# Altium footprint library master.PcbLib: 98 footprints (part 2 of 7)
Each footprint in its own frame and in the unit in brackets; x right, y up, seen from the top. Pads: shape width x height; smd on the part's side, far side on the other; paste and mask are expansions set on the pad; w line width, h text height; cw(c..) or ccw(c..) is an arc to the next point about the centre after c.
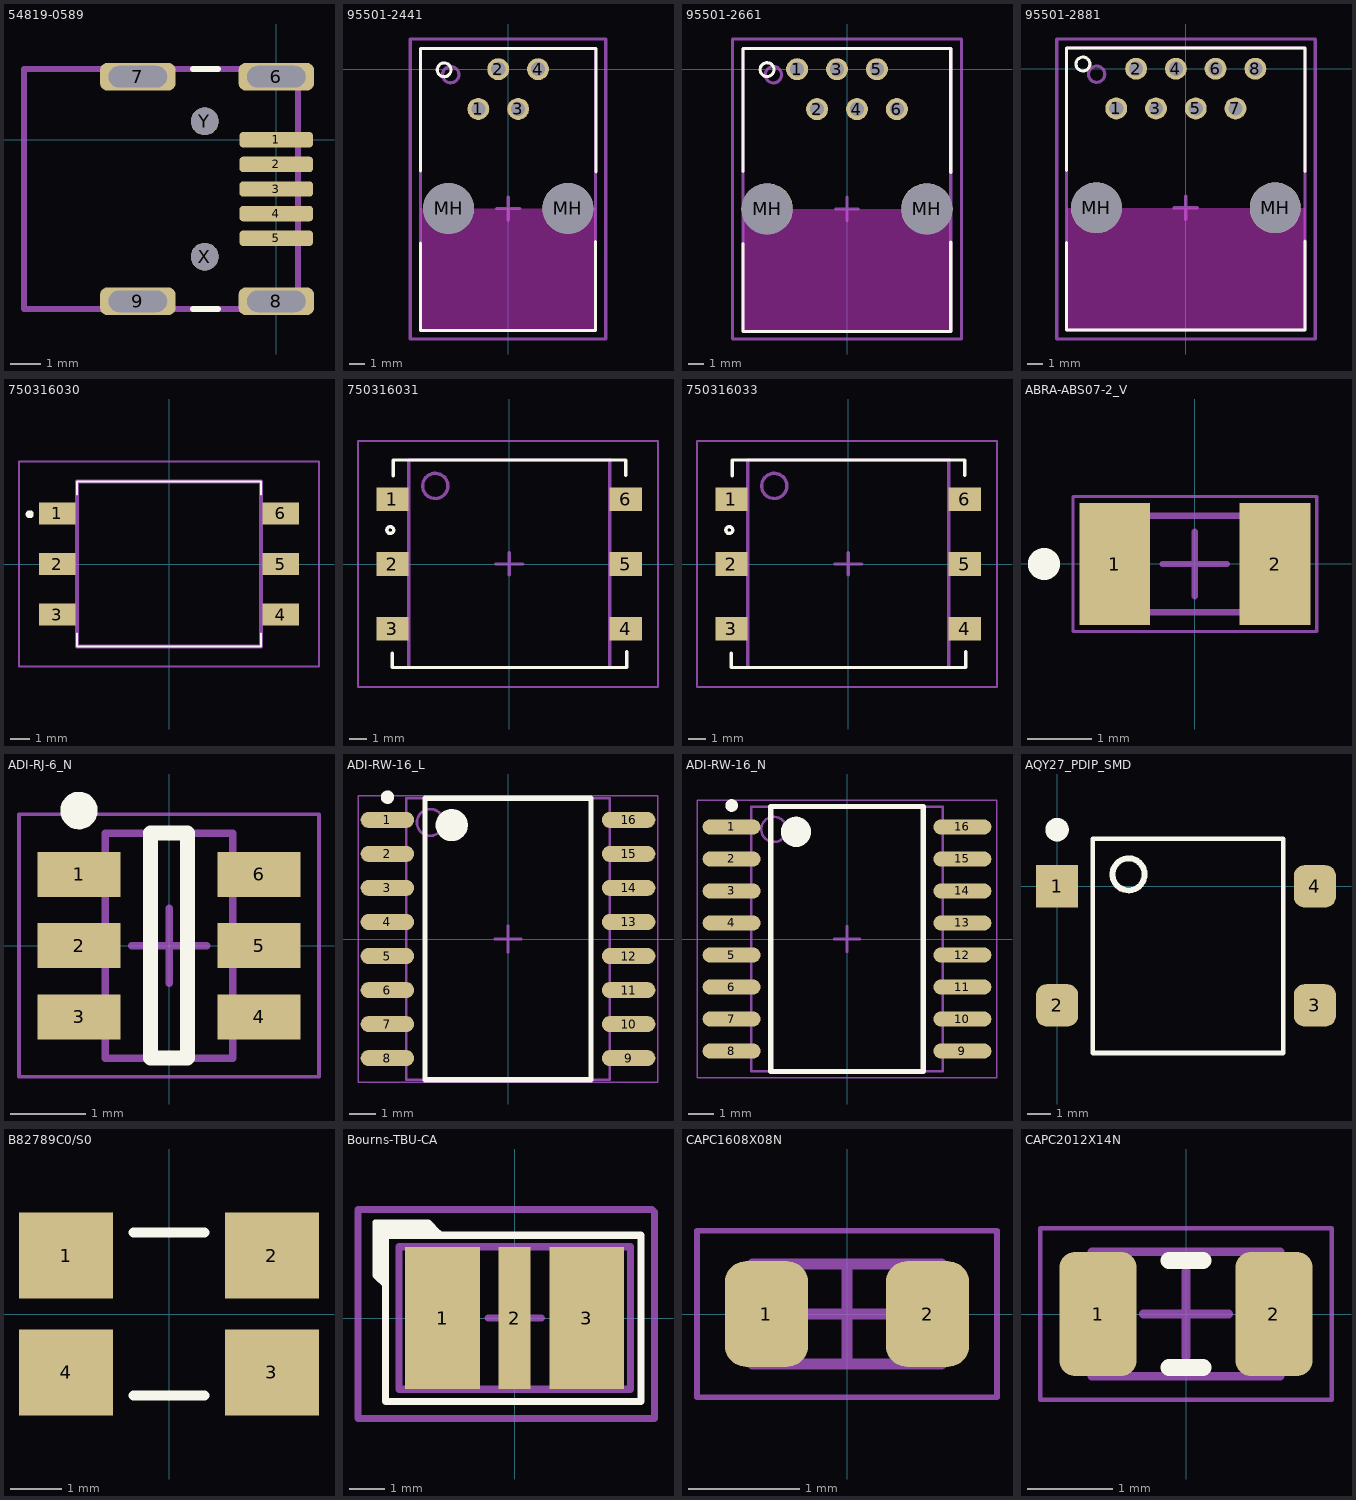
[diagram p1: the footprints below, top view; thin cyan lines are the x and y axes]

## 54819-0589 [mm] "Mini USB Connector, TH, Righer Angle"
height 3.95
pads (11):
  rrect50% 2.4x0.5 smd: 1(0,0) 2(0,-0.8) 3(0,-1.6) 4(0,-2.4) 5(0,-3.2)
  rrect50% 2.45x0.9 / inner rrect50% 0x0 / far side rrect50% 2.7x1.7 hole 0.7 slot 1.9 at 0 deg: 6(0,2.05) 7(-4.5,2.05) 8(0,-5.25) 9(-4.5,-5.25)
  round 0.9 hole 0.9 unplated: X(-2.325,-3.8) Y(-2.325,0.6)
Top Overlay:
  lines w0.2: -2.7,-5.5 -1.9,-5.5 ; -2.7,2.3 -1.9,2.3
Mechanical 15:
  lines w0.2: -8.2,-5.5 -8.2,2.3 0.7,2.3 0.7,-5.5 -8.2,-5.5
3D body "548190589.stp": height 4.05, standoff -1.8, extent -8.217,-5.457 0.783,2.243

## 95501-2441 [mm]
pads (6):
  round 1.4 hole 0.9: 1(-1.905,-2.54) 2(-0.635,0) 3(0.635,-2.54) 4(1.905,0)
  round 3.25 hole 3.25 unplated paste-10 mask+0.15: MH(-3.81,-8.89) MH(3.81,-8.89)
Top Overlay:
  circle w0.2: c-4.089,-0.041 r0.442
  lines w0.2: -5.59,-11.107 -5.59,-16.69 5.575,-16.69 5.575,-11.015 ; -5.59,-6.507 -5.59,1.33 5.6,1.33 5.6,-6.569
Keep-Out Layer:
  rectangle: -5.59,-16.69 5.575,-8.907
Mechanical 13:
  circle w0.2: c-3.67,-0.35 r0.52
  lines w0.2: -5.59,-16.69 5.575,-16.69 5.575,1.33 -5.59,1.33 -5.59,-16.69
Mechanical 15:
  lines w0.2: -0.737,-8.887 0.738,-8.887 ; 0,-9.625 0,-8.15 ; -6.25,-17.225 -6.25,1.925 6.225,1.925 6.225,-17.225 -6.25,-17.225
3D body "955012441.stp": height 11.55, standoff -3.25, extent -5.59,-16.77 5.59,1.33

## 95501-2661 [mm]
pads (8):
  round 1.4 hole 0.9: 1(-3.175,0) 2(-1.905,-2.54) 3(-0.635,0) 4(0.635,-2.54) 5(1.905,0) 6(3.175,-2.54)
  round 3.25 hole 3.25 unplated paste-10 mask+0.15: MH(-5.08,-8.89) MH(5.08,-8.89)
Top Overlay:
  circle w0.2: c-5.09,-0.024 r0.442
  lines w0.2: -6.625,-11.107 -6.625,-16.69 6.605,-16.69 6.605,-11.015 ; -6.625,-6.507 -6.625,1.33 6.605,1.33 6.605,-6.569
Keep-Out Layer:
  rectangle: -6.625,-16.69 6.605,-8.907
Mechanical 13:
  circle w0.2: c-4.685,-0.35 r0.52
  lines w0.2: -6.625,-16.69 6.605,-16.69 6.605,1.33 -6.625,1.33 -6.625,-16.69
Mechanical 15:
  lines w0.2: -0.737,-8.887 0.738,-8.887 ; 0,-9.625 0,-8.15 ; -7.3,-17.175 -7.3,1.925 7.3,1.925 7.3,-17.175 -7.3,-17.175
3D body "955012661.stp": height 11.55, standoff -3.25, extent -6.605,-16.77 6.605,1.33

## 95501-2881 [mm]
pads (10):
  round 1.4 hole 0.9: 1(-4.445,-2.54) 2(-3.175,0) 3(-1.905,-2.54) 4(-0.635,0) 5(0.635,-2.54) 6(1.905,0) 7(3.175,-2.54) 8(4.445,0)
  round 3.25 hole 3.25 unplated paste-10 mask+0.15: MH(-5.715,-8.89) MH(5.715,-8.89)
Top Overlay:
  circle w0.2: c-6.575,0.3 r0.442
  lines w0.2: -7.625,-11.107 -7.625,-16.69 7.625,-16.69 7.625,-11.015 ; -7.625,-6.507 -7.625,1.33 7.625,1.33 7.625,-6.569
Keep-Out Layer:
  rectangle: -7.625,-16.69 7.625,-8.907
Mechanical 13:
  circle w0.2: c-5.7,-0.35 r0.52
  lines w0.2: -7.625,-16.69 -7.625,1.33 7.625,1.33 7.625,-16.69 -7.625,-16.69
Mechanical 15:
  lines w0.2: -0.737,-8.887 0.738,-8.887 ; 0,-9.625 0,-8.15 ; -8.25,-17.275 8.275,-17.275 8.275,1.9 -8.25,1.9 -8.25,-17.275
3D body "955012881.stp": height 11.55, standoff -3.25, extent -7.62,-16.77 7.62,1.33

## 750316030 [mm]
pads (6):
  rect 1.83x1.09 smd: 1(-5.62,2.54) 2(-5.62,0) 3(-5.62,-2.54) 4(5.62,-2.54) 5(5.62,0) 6(5.62,2.54)
Top Overlay:
  lines w0.1: -4.625,-3.5 -4.625,-4.15 4.625,-4.15 4.625,-3.5 ; -4.625,3.5 -4.625,4.15 4.625,4.15 4.625,3.5
  lines w0.2: -7,2.4 ccw(c-7,2.5) -7,2.6 ccw(c-7,2.5) -7,2.4
Mechanical 13:
  lines w0.2: -4.625,-4.15 -4.625,4.15 4.625,4.15 4.625,-4.15 -4.625,-4.15
Mechanical 15:
  lines w0.1: -7.535,-5.15 -7.535,5.15 7.535,5.15 7.535,-5.15 -7.535,-5.15

## 750316031 [mm] "PUSH-PULL TRANSFORMER WE-PP 1:1 3.3v 1A"
height 11.05
pads (6):
  rect 1.9x1.4 smd: 1(-6.87,3.81) 2(-6.87,0) 3(-6.87,-3.81) 4(6.87,-3.81) 5(6.87,0) 6(6.87,3.81)
Top Overlay:
  circle w0.2: c-7,2 r0.2
  lines w0.2: -6.875,-5.25 -6.875,-6.1 6.925,-6.1 6.925,-5.175 ; -6.825,5.2 -6.825,6.125 6.875,6.125 6.875,5.225
Mechanical 13:
  circle w0.2: c-4.35,4.6 r0.743
  lines w0.2: -5.9,-6.1 5.925,-6.1 5.925,6.125 -5.9,6.125 -5.9,-6.1
Mechanical 15:
  lines w0.1: -8.9,-7.25 8.775,-7.25 8.775,7.25 -8.9,7.25 -8.9,-7.25
  lines w0.2: -0.775,0 0.8,0 ; 0,-0.65 0,0.663
3D body "Download_STP_250-1243 (rev1).STEP": height 11.52, standoff -0.01, extent -7.235,-6.095 7.235,6.095

## 750316033 [mm] "PUSH-PULL TRANSFORMER WE-PP 1.3:1 5:3.3v 1A"
height 11.05
pads (6):
  rect 1.9x1.4 smd: 1(-6.87,3.81) 2(-6.87,0) 3(-6.87,-3.81) 4(6.87,-3.81) 5(6.87,0) 6(6.87,3.81)
Top Overlay:
  circle w0.2: c-7,2 r0.2
  lines w0.2: -6.875,-5.25 -6.875,-6.1 6.925,-6.1 6.925,-5.175 ; -6.825,5.2 -6.825,6.125 6.875,6.125 6.875,5.225
Mechanical 13:
  circle w0.2: c-4.35,4.6 r0.743
  lines w0.2: -5.9,-6.1 -5.9,6.125 5.925,6.125 5.925,-6.1 -5.9,-6.1
Mechanical 15:
  lines w0.1: -8.9,-7.25 -8.9,7.25 8.775,7.25 8.775,-7.25 -8.9,-7.25
  lines w0.2: -0.775,0 0.8,0 ; 0,-0.65 0,0.663
3D body "Download_STP_250-1243 (rev1).STEP": height 11.52, standoff -0.01, extent -7.235,-6.095 7.235,6.095

## ABRA-ABS07-2_V [mm] "Hand Drawn, 2-Leads, Body 3.2x1.5mm, Pitch 2.5mm"
height 0.9
pads (2):
  rect 1.1x1.9 smd: 1(-1.25,0) 2(1.25,0)
Top Overlay:
  circle w0.25: c-2.35,0 r0.125
Mechanical 13:
  lines w0.1: -1.6,-0.75 -1.6,0.75 1.6,0.75 1.6,-0.75 -1.6,-0.75
Mechanical 15:
  lines w0.05: -1.9,-1.05 -1.9,1.05 1.9,1.05 1.9,-1.05 -1.9,-1.05
  lines w0.1: -0.5,0 0.5,0 ; 0,-0.5 0,0.5
3D body: height 0.9, standoff 0, extent -1.6,-0.75 1.6,0.75

## ADI-RJ-6_N [mm] "SOT23, 6-Leads, Body 2.9x1.6mm, Pitch 0.95mm, IPC Medium Density"
height 1.45
pads (6):
  rect 1.1x0.6 smd: 1(-1.2,0.95) 2(-1.2,0) 3(-1.2,-0.95) 4(1.2,-0.95) 5(1.2,0) 6(1.2,0.95)
Top Overlay:
  circle w0.25: c-1.2,1.8 r0.125
  lines w0.2: -0.25,-1.5 -0.25,1.5 0.25,1.5 0.25,-1.5 -0.25,-1.5
Mechanical 13:
  lines w0.1: -0.85,-1.5 -0.85,1.5 0.85,1.5 0.85,-1.5 -0.85,-1.5
Mechanical 15:
  lines w0.05: -2,-1.75 -2,1.75 2,1.75 2,-1.75 -2,-1.75
  lines w0.1: -0.5,0 0.5,0 ; 0,-0.5 0,0.5
3D body: height 1.45, standoff 0.05, extent -0.85,-1.5 0.85,1.5

## ADI-RW-16_L [mm] "SOIC, 16-Leads, Body 10.3x7.5mm, Pitch 1.27mm, IPC High Density"
height 2.65
pads (16):
  oval 2x0.6 smd: 1(-4.5,4.445) 2(-4.5,3.175) 3(-4.5,1.905) 4(-4.5,0.635) 5(-4.5,-0.635) 6(-4.5,-1.905) 7(-4.5,-3.175) 8(-4.5,-4.445) 9(4.5,-4.445) 10(4.5,-3.175) 11(4.5,-1.905) 12(4.5,-0.635) 13(4.5,0.635) 14(4.5,1.905) 15(4.5,3.175) 16(4.5,4.445)
Top Overlay:
  circle w0.6: c-2.1,4.25 r0.3
  circle w0.25: c-4.5,5.295 r0.125
  lines w0.2: -3.1,-5.25 -3.1,5.25 3.1,5.25 3.1,-5.25 -3.1,-5.25
Mechanical 13:
  circle w0.1: c-2.9,4.35 r0.5
  lines w0.1: -3.8,-5.25 3.8,-5.25 3.8,5.25 -3.8,5.25 -3.8,-5.25
Mechanical 15:
  lines w0.05: -5.6,-5.35 5.6,-5.35 5.6,5.35 -5.6,5.35 -5.6,-5.35
  lines w0.1: -0.5,0 0.5,0 ; 0,-0.5 0,0.5
3D body: height 2.65, standoff 0.1, extent -3.8,-5.25 3.8,5.25

## ADI-RW-16_N [mm] "SOIC, 16-Leads, Body 10.3x7.5mm, Pitch 1.27mm, IPC Medium Density"
height 2.65
pads (16):
  oval 2.3x0.6 smd: 1(-4.575,4.445) 2(-4.575,3.175) 3(-4.575,1.905) 4(-4.575,0.635) 5(-4.575,-0.635) 6(-4.575,-1.905) 7(-4.575,-3.175) 8(-4.575,-4.445) 9(4.575,-4.445) 10(4.575,-3.175) 11(4.575,-1.905) 12(4.575,-0.635) 13(4.575,0.635) 14(4.575,1.905) 15(4.575,3.175) 16(4.575,4.445)
Top Overlay:
  circle w0.25: c-4.575,5.295 r0.125
  circle w0.6: c-2.025,4.25 r0.3
  lines w0.2: -3.025,-5.25 -3.025,5.25 3.025,5.25 3.025,-5.25 -3.025,-5.25
Mechanical 13:
  circle w0.1: c-2.9,4.35 r0.5
  lines w0.1: -3.8,-5.25 -3.8,5.25 3.8,5.25 3.8,-5.25 -3.8,-5.25
Mechanical 15:
  lines w0.05: -5.95,-5.5 -5.95,5.5 5.95,5.5 5.95,-5.5 -5.95,-5.5
  lines w0.1: -0.5,0 0.5,0 ; 0,-0.5 0,0.5
3D body: height 2.65, standoff 0.1, extent -3.8,-5.25 3.8,5.25

## AQY27_PDIP_SMD [mm]
height 3.5
pads (4):
  rect 1.8x1.8 smd: 1(0,0)
  rrect50% 1.8x1.8 smd: 2(0,-5.08) 3(11,-5.08) 4(11,0)
Top Overlay:
  circle w0.254: c3.048,0.508 r0.684
  circle w0.6: c0,2.413 r0.2
  lines w0.2: 1.524,-7.112 1.524,2.032 6.77,2.032 9.652,2.032 9.652,-7.112 1.524,-7.112
3D body: height 2.15, standoff -2.15, extent 0.127,2.54 0.127,2.54
3D body: height 3.5, standoff 0.2, extent 1.143,-7.175 10.033,2.096

## B82789C0/S0 [mm] "SIMDAD 1812, common-mode chokes"
height 3
pads (4):
  rect 1.85x1.7 smd: 1(-2.025,1.15) 2(2.025,1.15) 3(2.025,-1.15) 4(-2.025,-1.15)
Top Overlay:
  lines w0.2: -0.7,-1.6 0.7,-1.6 ; -0.7,1.6 0.7,1.6
3D body: height 2.45, standoff 1.95, extent -2.6,-1.3 2.6,1.3
3D body: height 2.2, standoff 0, extent -2.275,0.9 -2.25,1.6
3D body: height 2.2, standoff 0, extent -2.275,-1.6 -2.25,-0.9
3D body: height 2.2, standoff 0, extent 2.25,0.9 2.275,1.6
3D body: height 2.2, standoff 0, extent 2.25,-1.6 2.275,-0.9
3D body: height 0.03, standoff 0, extent -2.25,0.9 -1.5,1.6
3D body: height 0.03, standoff 0, extent -2.25,-1.6 -1.5,-0.9
3D body: height 0.03, standoff 0, extent 1.5,0.9 2.25,1.6
3D body: height 0.03, standoff 0, extent 1.5,-1.6 2.25,-0.9
3D body: height 3, standoff 0.4, extent -2.25,-1.6 2.25,1.6

## Bourns-TBU-CA [mm] "TBU-CA085-200-WH; Bi-Directional TVS Diode; 12-Pin DFN"
height 0.5
pads (3):
  rect 2.1x4 smd paste-5 mask-5: 1(-2.025,0) 3(2.025,0)
  rect 0.9x4 smd paste-5 mask-5: 2(0,0)
Top Overlay:
  region: -2.12,2.395 -3.62,2.395 -3.62,0.895 -3.92,1.195 -3.92,2.695 -2.42,2.695
  lines w0.15: -3.62,0.895 -3.92,1.195 -3.92,2.695 -2.42,2.695 -2.12,2.395
  lines w0.2: -3.625,-2.35 -3.625,2.325 3.55,2.325 3.55,-2.35 -3.625,-2.35
Top Paste:
  rectangle: -0.4,0.1 0.4,1.7
  rectangle: 1.1,0.075 2.95,1.7
  rectangle: 1.1,-1.7 2.95,-0.15
  rectangle: -0.4,-1.7 0.4,-0.15
  region: -1.1,1.7 -1.1,0.125 -2.95,0.125 -2.95,1.7
  region: -1.1,-0.15 -1.1,-1.7 -2.725,-1.7 -2.95,-1.475 -2.95,-0.15
Top Solder:
  rectangle: 1.1,-1.7 2.95,1.7
  rectangle: -0.4,-1.7 0.4,1.7
  region: -1.1,1.7 -1.1,-1.7 -2.725,-1.7 -2.95,-1.475 -2.95,1.7
Mechanical 13:
  circle w0.2: c-2,0 r0.437
  lines w0.2: -3.25,-2 3.25,-2 3.25,2 -3.25,2 -3.25,-2
Mechanical 15:
  lines w0.2: -0.75,0 0.75,0 ; 0,-0.825 0,0.825 ; -4.4,-2.825 3.925,-2.825 3.925,2.975 3.85,3.05 -4.4,3.05 -4.4,-2.825
3D body "tbu-ca.stp": height 0.85, standoff -0.03, extent -3.25,-2 3.25,2

## CAPC1608X08N [mm] "Chip Capacitor, 2-Leads, Body 1,60x0,80mm, IPC Medium Density"
height 0.8
pads (2):
  rrect50% 0.75x0.95 smd: 1(-0.725,0) 2(0.725,0)
Mechanical 13:
  lines w0.1: -0.85,-0.45 -0.85,0.45 0.85,0.45 0.85,-0.45 -0.85,-0.45
Mechanical 15:
  lines w0.05: -1.35,-0.75 -1.35,0.75 1.35,0.75 1.35,-0.75 -1.35,-0.75
  lines w0.1: -0.45,0 0.45,0 ; 0,-0.45 0,0.45
3D body "CAPC1608X08N.step": height 0.8, standoff 0, extent -0.85,-0.45 0.85,0.45

## CAPC2012X14N [mm] "Chip Capacitor, 2-Leads, Body 2,00x1,25mm, IPC Medium Density"
height 1.45
pads (2):
  rrect40% 0.9x1.45 smd: 1(-1.025,0) 2(1.025,0)
Top Overlay:
  lines w0.2: -0.2,-0.625 0.2,-0.625 ; -0.2,0.625 0.2,0.625
Mechanical 13:
  lines w0.1: -1.1,-0.725 1.1,-0.725 1.1,0.725 -1.1,0.725 -1.1,-0.725
Mechanical 15:
  lines w0.05: -1.7,-1 -1.7,1 1.7,1 1.7,-1 -1.7,-1
  lines w0.1: -0.5,0 0.5,0 ; 0,-0.5 0,0.5
3D body "CAPC2012X14N.step": height 1.45, standoff 0, extent -1.1,-0.725 1.1,0.725